# Altium footprint library Sajad_Altium_Library.PcbLib: 333 footprints (part 6 of 21)
Each footprint in its own frame and in the unit in brackets; x right, y up, seen from the top. Pads: shape width x height; smd on the part's side, far side on the other; paste and mask are expansions set on the pad; w line width, h text height; cw(c..) or ccw(c..) is an arc to the next point about the centre after c.
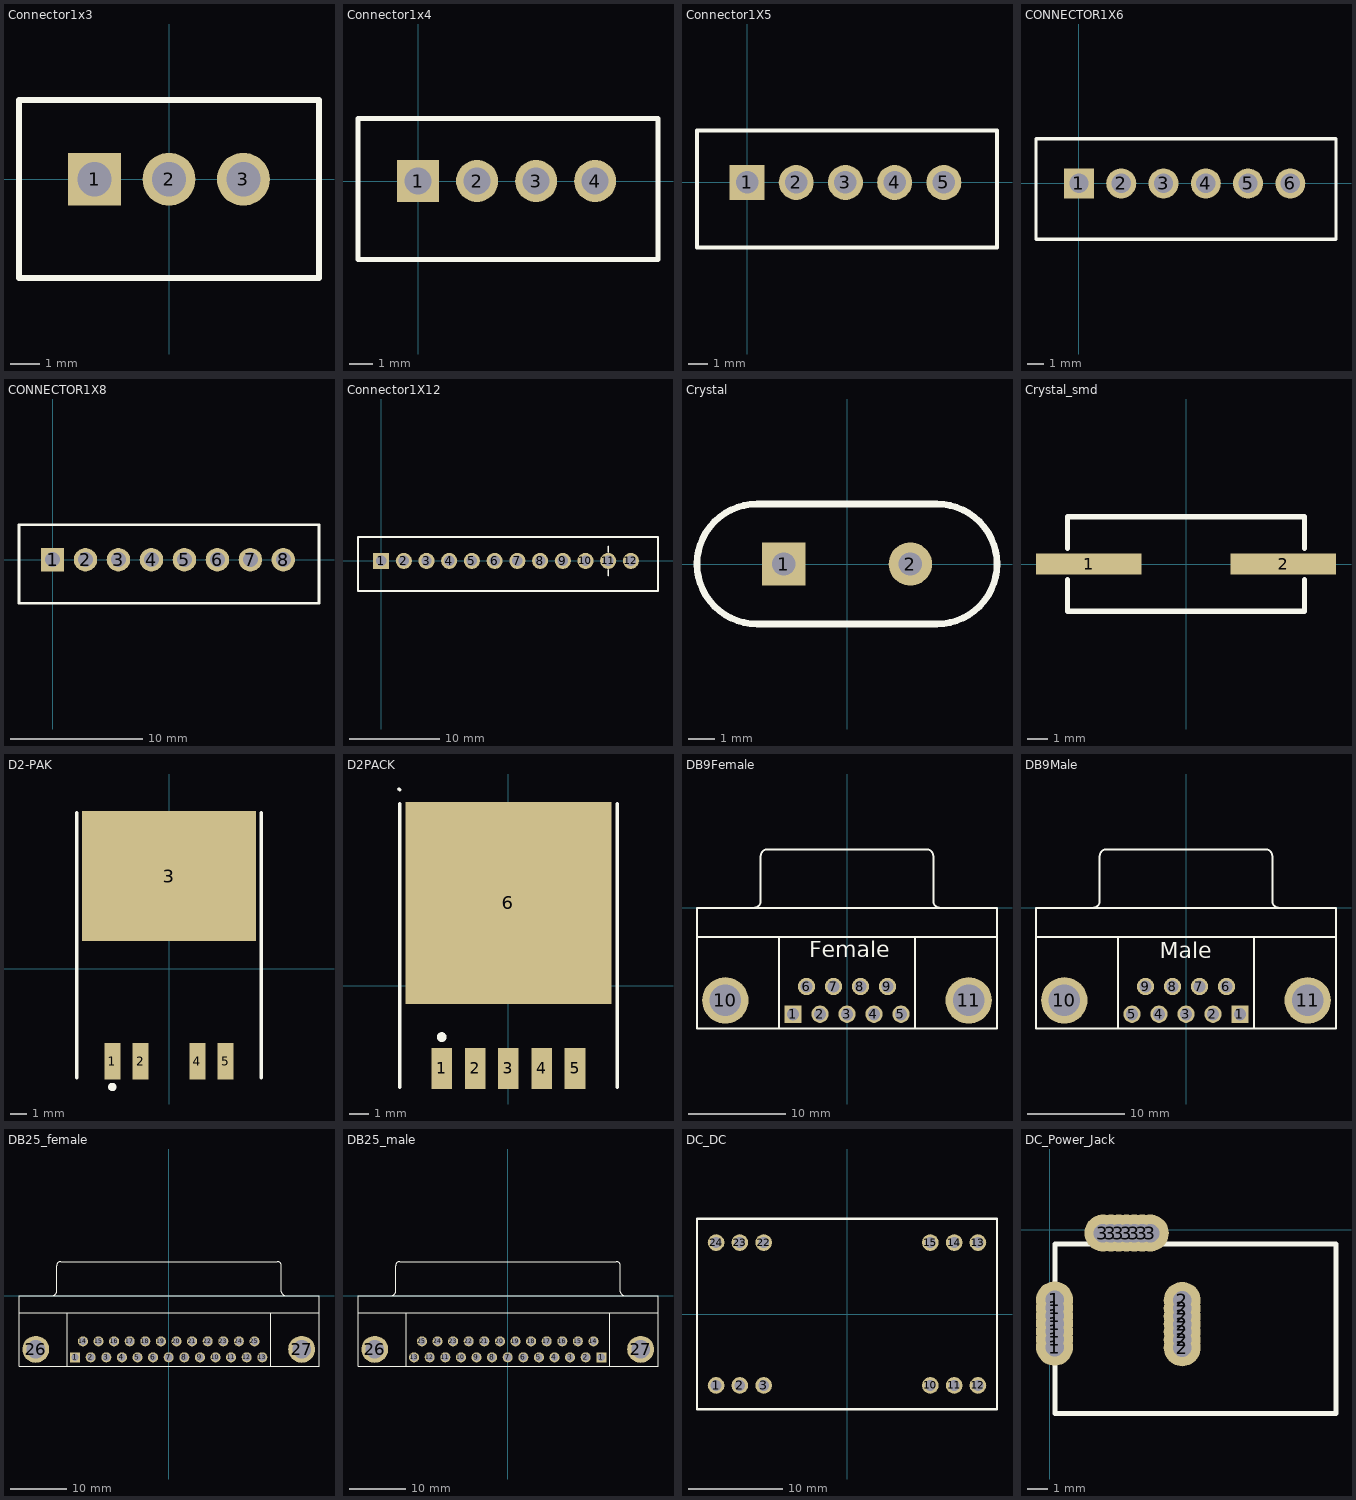
[diagram p5: the footprints below, top view; thin cyan lines are the x and y axes]

## Connector1x3 [mil] "Connector; Header; 3 Position"
pads (3):
  rect 70x70 hole 45: 1(-98.43,0)
  round 70 hole 45: 2(0,0) 3(98.43,0)
Top Overlay:
  lines w7.87: -198.43,-130.8 -198.43,105 198.43,105 198.43,-130.8 -198.43,-130.8
3D body: height 275.59, standoff -133.86, extent -242.52,-128.19 245.67,98.19

## Connector1x4 [mil] "Connector; Header; 4 Position"
pads (4):
  rect 70x70 hole 45: 1(0,0)
  round 70 hole 45: 2(98.43,0) 3(196.85,0) 4(295.28,0)
Top Overlay:
  lines w7.87: -100,-130.8 -100,104.2 400,104.2 400,-130.8 -100,-130.8
3D body: height 275.59, standoff -133.86, extent -94.1,-133.19 394.1,93.19

## Connector1X5 [mil] "Connector; Header; 5 Position"
pads (5):
  rect 70x70 hole 45: 1(0,0)
  round 70 hole 45: 2(98.43,0) 3(196.85,0) 4(295.28,0) 5(393.7,0)
Top Overlay:
  lines w7.87: -100,-130.3 500,-130.3 500,104.2 -100,104.2 -100,-130.3
3D body: height 275.59, standoff -133.86, extent -93.3,-133.19 493.31,93.19

## CONNECTOR1X6 [mil] "Connector; Header; 6 Position"
pads (6):
  rect 70x70 hole 45: 1(0,0)
  round 70 hole 45: 2(98.43,0) 3(196.85,0) 4(295.28,0) 5(393.7,0) 6(492.13,0)
Top Overlay:
  lines w7.87: -100,-130.3 -100,104.2 598.43,104.2 598.43,-130.3 -100,-130.3
3D body: height 275.59, standoff -133.86, extent -44.09,-133.19 542.52,93.19

## CONNECTOR1X8 [mil] "Connector; Header; 8 Position"
pads (8):
  rect 70x70 hole 45: 1(0,0)
  round 70 hole 45: 2(98.43,0) 3(196.85,0) 4(295.28,0) 5(393.7,0) 6(492.13,0) 7(590.55,0) 8(688.98,0)
Top Overlay:
  lines w7.87: 795,-130.3 -100,-130.3 -100,104.2 795,104.2 ; 795.28,-130.3 795.28,104.2
3D body: height 275.59, standoff -133.86, extent -44.09,-133.19 542.52,93.19

## Connector1X12 [mil] "Connector 1x12"
pads (12):
  rect 70x70 hole 45: 1(0,0)
  round 70 hole 45: 2(98.43,0) 3(196.85,0) 4(295.28,0) 5(393.7,0) 6(492.13,0) 7(590.55,0) 8(688.98,0) 9(787.4,0) 10(885.83,0) 11(984.25,0) 12(1082.68,0)
Top Overlay:
  lines w7.87: 984.25,-63.7 984.25,-38.7 ; 984.25,38.7 984.25,63.7 ; -100,-130.3 1200,-130.3 1200,103.7 -100,103.7 -100,-130.3
3D body: height 120.08, standoff -253.94, extent -95.59,-361.38 1180,91.38

## Crystal [mil] "16 Mhz Crystal footprint"
pads (2):
  rect 65x65 hole 35: 1(-95,0)
  round 65 hole 35: 2(95,0)
Top Overlay:
  lines w10: -225,0 cw(c-135,0) -135,90 0,90 135,90 cw(c135,0) 225,0 cw(c135,0) 135,-90 0,-90 -135,-90 cw(c-135,0) -225,0
3D body: height 142.73, standoff -77.74, extent -219.93,-88.96 219.93,95

## Crystal_smd [mil] "16 Mhz Crystal footprint"
pads (2):
  rect 200x40 smd: 1(-185,0) 2(185,0)
Top Overlay:
  lines w10: -225,-30 -225,-90 0,-90 225,-90 225,-30 ; -225,30 -225,90 0,90 225,90 225,30
3D body: height 162.17, standoff 4.69, extent -246.43,-94.48 245.7,94.5

## D2-PAK [mm] "D2-PAK; 5 Leads (1 Cropped); Body 15.3 (inc. leads) x 10.4 mm (LxW max)"
height 4.55
pads (5):
  rect 0.95x2.2 smd: 1(-3.4,-5.55) 2(-1.7,-5.55) 4(1.7,-5.55) 5(3.4,-5.55)
  rect 10.45x7.8 smd: 3(0,5.55)
Top Overlay:
  circle w0.25: c-3.4,-7.1 r0.125
  lines w0.2: -5.525,-6.55 -5.525,9.35 ; 5.525,-6.55 5.525,9.35

## D2PACK [mm]
pads (6):
  rect 1.05x2.1 smd: 1(-3.4,-4.225) 2(-1.7,-4.225) 3(0,-4.225) 4(1.7,-4.225) 5(3.4,-4.225)
  rect 10.5x10.3 smd: 6(0,4.225)
Top Overlay:
  circle w0.25: c-3.4,-2.625 r0.125
  lines w0.178: -5.588,10.033 -5.55,9.995 ; -5.55,-5.175 -5.55,9.275 ; 5.55,-5.175 5.55,9.275

## DB9Female [mm] "DB9 Serial Connector"
pads (11):
  rect 1.778x1.778 hole 1.27: 1(-5.54,-10.92)
  round 1.778 hole 1.27: 2(-2.77,-10.92) 3(0,-10.92) 4(2.77,-10.92) 5(5.54,-10.92) 6(-4.155,-8.08) 7(-1.385,-8.08) 8(1.385,-8.08) 9(4.155,-8.08)
  round 4.76 hole 3.26: 10(-12.495,-9.5) 11(12.495,-9.5)
Top Overlay:
  lines w0.2: -15.4,-3 15.4,-3 ; -9.56,0.005 ccw(c-9.56,0.7) -8.865,0.7 -8.865,5.3 ; -8.86,5.305 cw(c-8.165,5.305) -8.165,6 8.165,6 cw(c8.165,5.305) 8.86,5.305 ; -7,-12.4 -7,-3 ; 7,-12.4 7,-3 ; 8.865,5.3 8.865,0.7 ccw(c9.56,0.7) 9.56,0.005 ; -15.4,-12.4 15.4,-12.4 15.4,0 -15.4,0 -15.4,-12.4
  text "Female" at -3.861,-5.613 h2.79
3D body: height 12.62, standoff -4.25, extent -15.43,-12.624 15.38,8.176

## DB9Male [mm] "DB9 Serial Connector"
pads (11):
  rect 1.778x1.778 hole 1.27: 1(5.54,-10.92)
  round 1.778 hole 1.27: 2(2.77,-10.92) 3(0,-10.92) 4(-2.77,-10.92) 5(-5.54,-10.92) 6(4.155,-8.08) 7(1.385,-8.08) 8(-1.385,-8.08) 9(-4.155,-8.08)
  round 4.76 hole 3.26: 10(-12.495,-9.5) 11(12.495,-9.5)
Top Overlay:
  lines w0.2: -15.4,-3 15.4,-3 ; -9.56,0.005 ccw(c-9.56,0.7) -8.865,0.7 -8.865,5.3 ; -8.86,5.305 cw(c-8.165,5.305) -8.165,6 8.165,6 cw(c8.165,5.305) 8.86,5.305 ; -7,-12.4 -7,-3 ; 7,-12.4 7,-3 ; 8.865,5.3 8.865,0.7 ccw(c9.56,0.7) 9.56,0.005 ; -15.4,-12.4 15.4,-12.4 15.4,0 -15.4,0 -15.4,-12.4
  text "Male" at -2.692,-5.74 h2.79
3D body: height 11.25, standoff -5.15, extent -15.225,-12.818 15.275,4.882

## DB25_female [mil] "Connector; D Subminiature; 25 Position; Right Angle; Pitch 1.385 mm"
height 509.06
pads (27):
  rect 70x70 hole 50: 1(-652.2,-429.92)
  round 70 hole 50: 2(-543.5,-429.92) 3(-434.8,-429.92) 4(-326.1,-429.92) 5(-217.4,-429.92) 6(-108.7,-429.92) 7(0,-429.92) 8(108.7,-429.92) 9(217.4,-429.92) 10(326.1,-429.92) 11(434.8,-429.92) 12(543.5,-429.92) 13(652.2,-429.92) 14(-597.85,-318.11) 15(-489.15,-318.11) 16(-380.45,-318.11) 17(-271.75,-318.11) 18(-163.05,-318.11) 19(-54.35,-318.11) 20(54.35,-318.11) 21(163.05,-318.11) 22(271.75,-318.11) 23(380.45,-318.11) 24(489.15,-318.11) 25(597.85,-318.11)
  round 187.4 hole 128.35: 26(-926.22,-374.02) 27(926.22,-374.02)
Top Overlay:
  lines w7.87: -1043.15,-118.11 1047.4,-118.11 ; -808.7,0.2 ccw(c-808.7,27.56) -781.34,27.56 -781.34,208.66 ; -781.14,208.86 cw(c-753.78,208.86) -753.78,236.22 758.03,236.22 cw(c758.03,208.86) 785.39,208.86 ; -706.54,-492.13 -706.54,-118.11 ; 710.79,-492.13 710.79,-118.11 ; 785.59,208.66 785.59,27.56 ccw(c812.95,27.56) 812.95,0.2 ; -1043.15,-492.13 -1043.15,0 1047.4,0 1047.4,-492.13 -1043.15,-492.13
3D body: height 500, standoff -177.17, extent -1055.99,-492.68 1049.12,231.73

## DB25_male [mil] "Connector; D Subminiature; 25 Position; Right Angle; Pitch 1.385 mm"
height 509.06
pads (27):
  rect 70x70 hole 50: 1(652.2,-429.92)
  round 70 hole 50: 2(543.5,-429.92) 3(434.8,-429.92) 4(326.1,-429.92) 5(217.4,-429.92) 6(108.7,-429.92) 7(0,-429.92) 8(-108.7,-429.92) 9(-217.4,-429.92) 10(-326.1,-429.92) 11(-434.8,-429.92) 12(-543.5,-429.92) 13(-652.2,-429.92) 14(597.85,-318.11) 15(489.15,-318.11) 16(380.45,-318.11) 17(271.75,-318.11) 18(163.05,-318.11) 19(54.35,-318.11) 20(-54.35,-318.11) 21(-163.05,-318.11) 22(-271.75,-318.11) 23(-380.45,-318.11) 24(-489.15,-318.11) 25(-597.85,-318.11)
  round 187.4 hole 128.35: 26(-926.22,-374.02) 27(926.22,-374.02)
Top Overlay:
  lines w7.87: -1043.15,-118.11 1047.4,-118.11 ; -808.7,0.2 ccw(c-808.7,27.56) -781.34,27.56 -781.34,208.66 ; -781.14,208.86 cw(c-753.78,208.86) -753.78,236.22 758.03,236.22 cw(c758.03,208.86) 785.39,208.86 ; -706.54,-492.13 -706.54,-118.11 ; 710.79,-492.13 710.79,-118.11 ; 785.59,208.66 785.59,27.56 ccw(c812.95,27.56) 812.95,0.2 ; -1043.15,-492.13 1047.4,-492.13 1047.4,0 -1043.15,0 -1043.15,-492.13
3D body: height 500, standoff -177.17, extent -1055.99,-492.68 1049.12,231.73

## DC_DC [mil] "dc to dc footprint"
pads (12):
  round 70 hole 45: 1(-550,-300) 2(-450,-300) 3(-350,-300) 10(350,-300) 11(450,-300) 12(550,-300) 13(550,300) 14(450,300) 15(350,300) 22(-350,300) 23(-450,300) 24(-550,300)
Top Overlay:
  lines w10: -630,-400 -630,400 630,400 630,-400 -630,-400

## DC_Power_Jack [mil]
height 500
pads (21):
  round 70 hole 35: 1(9.33,-221.81) 1(9.33,-206.81) 1(9.33,-191.81) 1(9.33,-177.17) 1(9.33,-162.52) 1(9.33,-147.52) 1(9.33,-132.52) 2(250.31,-222.79) 2(250.31,-207.79) 2(250.31,-192.79) 2(250.31,-178.15) 2(250.31,-163.5) 2(250.31,-148.5) 2(250.31,-133.5) 3(100.71,-6.3) 3(115.71,-6.3) 3(130.71,-6.3) 3(145.35,-6.3) 3(160,-6.3) 3(175,-6.3) 3(190,-6.3)
Top Overlay:
  lines w10: 10.31,-346.97 10.31,-26.97 540.67,-26.97 540.67,-346.97 10.31,-346.97
3D body: height 433.07, standoff -200.79, extent -15,-367.91 555.87,17.91